# Altium footprint library OT Library.PcbLib: 396 footprints (part 9 of 25)
Each footprint in its own frame and in the unit in brackets; x right, y up, seen from the top. Pads: shape width x height; smd on the part's side, far side on the other; paste and mask are expansions set on the pad; w line width, h text height; cw(c..) or ccw(c..) is an arc to the next point about the centre after c.
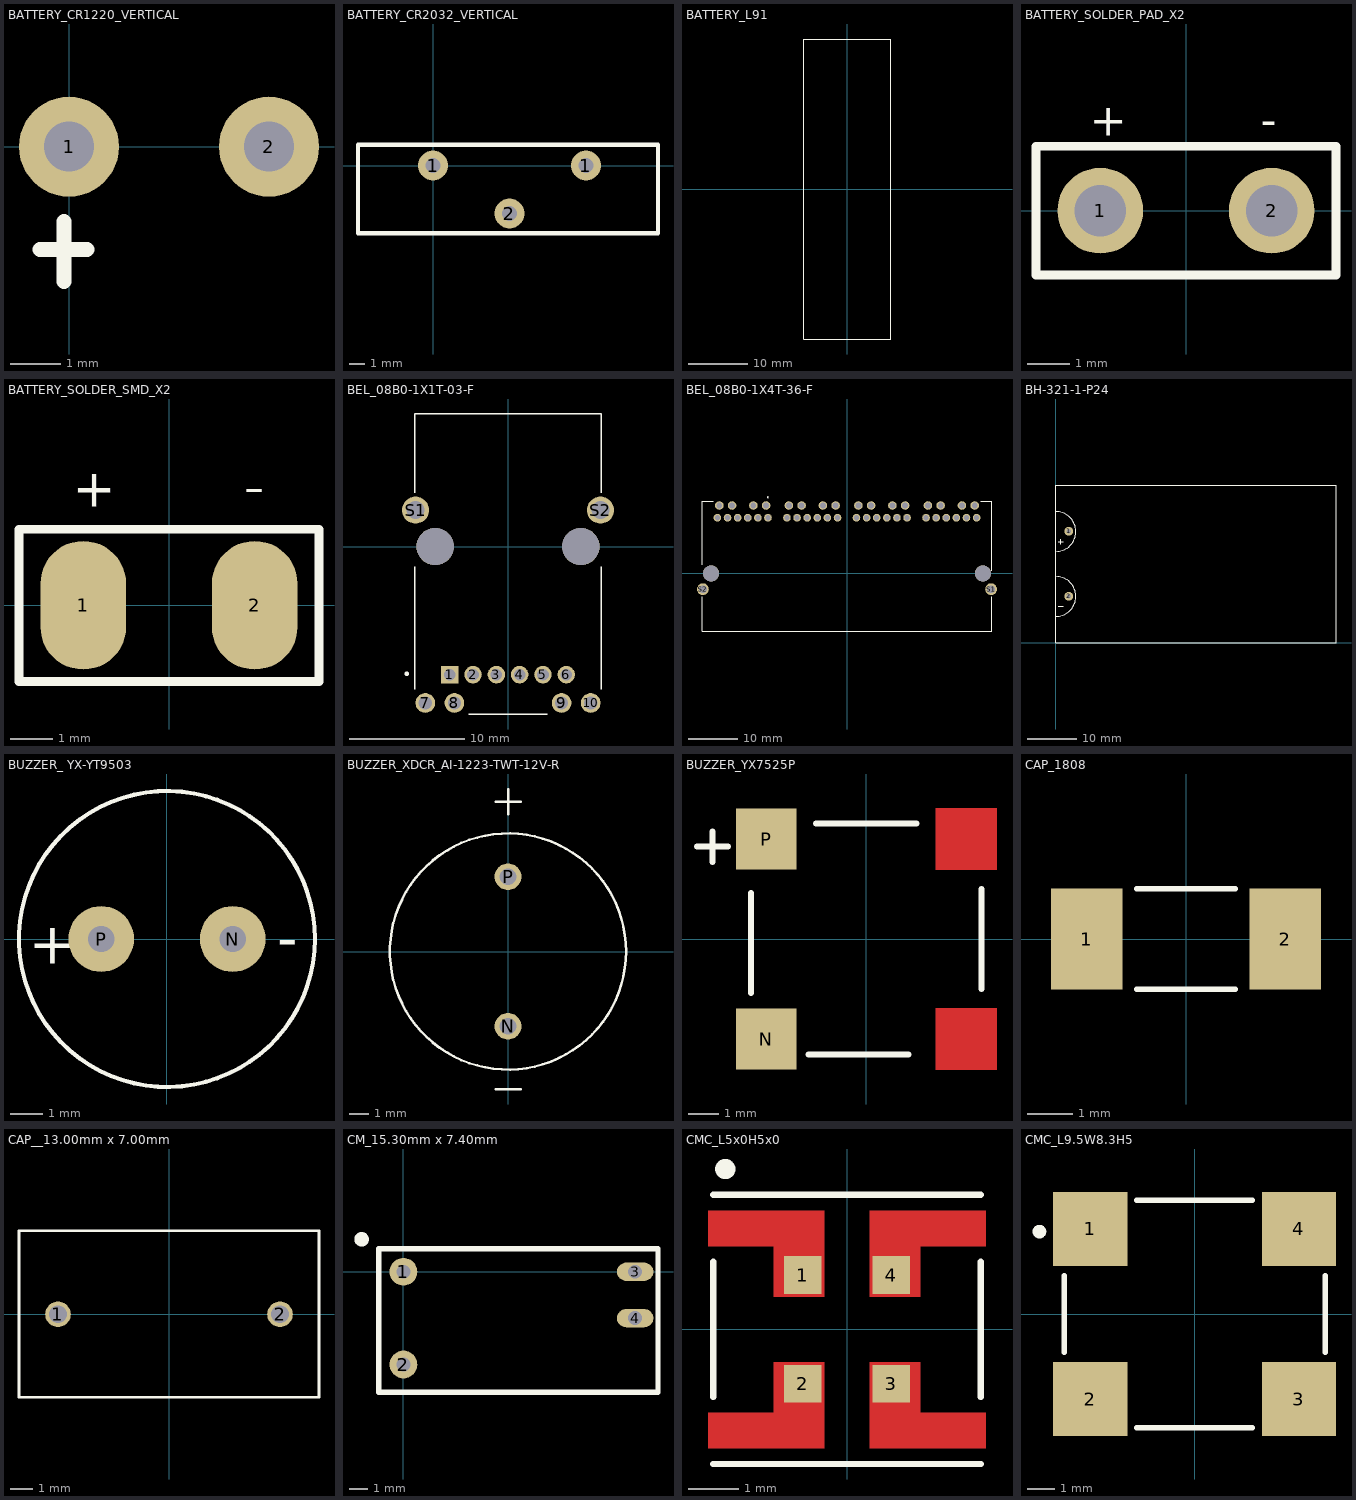
[diagram p8: the footprints below, top view; thin cyan lines are the x and y axes]

## BATTERY_CR1220_VERTICAL [mm]
pads (2):
  round 2 hole 1: 1(0,0) 2(4,0)
Top Overlay:
  lines w0.3: -0.584,-2.057 0.356,-2.057 ; -0.102,-2.692 -0.102,-1.499
3D body: height 15.18, standoff -1.17, extent -4.42,-0.145 8.18,3.505

## BATTERY_CR2032_VERTICAL [mm]
pads (3):
  round 2 hole 1: 1(0,0) 1(10.2,0) 2(5.1,-3.2)
Top Overlay:
  lines w0.3: -5,-4.5 15,-4.5 15,1.372 -5,1.372 -5,-4.5
3D body: height 22.01, standoff -3, extent -5.008,-3.558 15.008,0.25

## BATTERY_L91 [mm]
Top Overlay:
  lines w0.2: -7.366,-25.4 -7.366,25.4 -7.112,25.4 7.366,25.4 7.366,-25.4 -7.366,-25.4
3D body: height 9.25, standoff -5.25, extent -7.252,-25.375 7.252,25.375

## BATTERY_SOLDER_PAD_X2 [mm] "4MM"
pads (2):
  round 2 hole 1.2: 1(-2,0) 2(2,0)
Top Overlay:
  lines w0.2: -3.5,-1.5 3.5,-1.5 3.5,1.5 -3.5,1.5 -3.5,-1.5
  text "-" at 1.75,1.75 h0.76
  text "+" at -2.25,1.75 h0.76

## BATTERY_SOLDER_SMD_X2 [mm] "4MM"
pads (2):
  oval 2x3 smd: 1(-2,0) 2(2,0)
Top Overlay:
  lines w0.2: -3.5,-1.778 -3.5,1.778 3.5,1.778 3.5,-1.778 -3.5,-1.778
  text "+" at -2.25,2.004 h1.5
  text "-" at 1.75,2.004 h1.7
3D body: height 0.3, standoff -0.05, extent -3.057,-1.533 -1.007,1.533
3D body: height 0.3, standoff -0.05, extent 0.975,-1.533 3.025,1.533

## BEL_08B0-1X1T-03-F [mil]
pads (14):
  rect 60x60 hole 40: 1(-200,-440)
  round 60 hole 40: 2(-120,-440) 3(-40,-440) 4(40,-440) 5(120,-440) 6(200,-440)
  round 67.5 hole 45: 7(-284,-537) 8(-184,-537) 9(184,-537) 10(284,-537)
  round 93 hole 62: S1(-317.5,125) S2(317.5,125)
  round 128 hole 128 unplated: ""(-250,0) ""(250,0)
Top Overlay:
  circle w7.87: c-347.71,-436.67 r3.94
  lines w5: -321,-490 -321,-70 ; -321,185 -321,455 321,455 321,185 ; -135,-575 135,-575 ; 321,-490 321,-70
3D body: height 606, standoff -130, extent -375.87,-572.99 375.88,457.01

## BEL_08B0-1X4T-36-F [mil]
pads (44):
  round 60 hole 40: 1_1(-625,440) 1_2(-75,440) 1_3(475,440) 1_4(1025,440) 2_1(-705,440) 2_2(-155,440) 2_3(395,440) 2_4(945,440) 3_1(-785,440) 3_2(-235,440) 3_3(315,440) 3_4(865,440) 4_1(-865,440) 4_2(-315,440) 4_3(235,440) 4_4(785,440) 5_1(-945,440) 5_2(-395,440) 5_3(155,440) 5_4(705,440) 6_1(-1025,440) 6_2(-475,440) 6_3(75,440) 6_4(625,440)
  round 67.5 hole 45: 7_1(-640.5,537) 7_2(-90.5,537) 7_3(459.5,537) 7_4(1009.5,537) 8_1(-740.5,537) 8_2(-190.5,537) 8_3(359.5,537) 8_4(909.5,537) 9_1(-909.5,537) 9_2(-359.5,537) 9_3(190.5,537) 9_4(740.5,537) 10_1(-1009.5,537) 10_2(-459.5,537) 10_3(90.5,537) 10_4(640.5,537)
  round 93 hole 62: S1(1140,-125) S2(-1140,-125)
  round 128 hole 128 unplated: ""(-1075,0) ""(1075,0)
Top Overlay:
  circle w7.87: c-625,601.67 r3.94
  lines w5: -1146,-185 -1146,-457 1146,-457 1146,-185 ; -1146,70 -1146,570 -1056,570 ; 1056,570 1146,570 1146,20
3D body: height 568.45, standoff -140, extent -1200.46,-455 1200.45,570

## BH-321-1-P24 [mm]
pads (2):
  round 1.8 hole 0.9: 1(2.6,22.675) 2(2.6,9.425)
Top Overlay:
  lines w0.2: 0,5.334 ccw(c0,9.398) 0,13.462 ; 0,18.542 ccw(c0,22.606) 0,26.67 ; 0,32 0,0 57,0 ; 0,32.004 57,32.004 57,0.004 ; 0.508,7.366 1.524,7.366 ; 0.508,20.574 1.524,20.574 ; 1.016,20.066 1.016,21.082
3D body: height 15.7, standoff -13.1, extent -0.102,-0.048 56.998,32.052

## BUZZER_ YX-YT9503 [mm] "9.00x5.50"
height 5
pads (2):
  round 2 hole 0.8: N(2,0) P(-2,0)
Top Overlay:
  circle w0.127: c0,0 r4.5
  text "-" at 3.353,-0.584 h1.27
  text "+" at -4.197,-0.752 h1.27
3D body: height 4.8, standoff -4.5, extent -4.474,-4.5 4.526,4.5

## BUZZER_XDCR_AI-1223-TWT-12V-R [mm] "12.00x9.50"
height 9.7
pads (2):
  round 1.358 hole 0.85: N(0,-3.8) P(0,3.8)
Top Overlay:
  circle w0.127: c0,0 r6
  lines w0.127: -0.635,-6.985 0.635,-6.985 ; -0.635,7.62 0.635,7.62 ; 0,6.985 0,8.255
3D body: height 9.75, standoff -5.8, extent -6,-6 5.999,7.44

## BUZZER_YX7525P [mm] "7.50x7.50"
height 2.5
pads (2):
  rect 2x2 smd: N(-3.302,-3.302) P(-3.302,3.302)
Top Layer:
  rectangle: 2.286,2.286 4.318,4.318
  rectangle: 2.286,-4.318 4.318,-2.286
Top Overlay:
  lines w0.2: -5.588,3.048 -4.572,3.048 ; -5.08,2.54 -5.08,3.556 ; -3.81,-1.778 -3.81,1.524 ; -1.905,-3.81 1.397,-3.81 ; -1.651,3.81 1.651,3.81 ; 3.81,-1.651 3.81,1.651
Top Solder:
  rectangle: 2.286,-4.318 4.318,-2.286
  rectangle: 2.286,2.286 4.318,4.318
3D body: height 2.5, standoff -0.01, extent -3.75,-3.75 3.75,3.75

## CAP_1808 [mm] "0.185\" L x 0.079\" W (4.70mm x 2.00mm)"
height 1.75
pads (2):
  rect 1.56x2.22 smd: 1(-2.175,0) 2(2.175,0)
Top Overlay:
  lines w0.127: -1.08,-1.1 1.08,-1.1 ; -1.08,1.1 1.08,1.1
3D body: height 1.75, standoff 0, extent -2.35,-1 2.35,1

## CAP__13.00mm x 7.00mm [mm]
pads (2):
  round 1.15 hole 0.8: 1(-5,0) 2(5,0)
Top Overlay:
  lines w0.127: -6.756,-3.734 6.756,-3.734 6.756,3.759 -6.756,3.759 -6.756,-3.734
3D body: height 13.51, standoff -5.08, extent -6.756,-3.746 6.756,3.746

## CM_15.30mm x 7.40mm [mil]
pads (4):
  round 60 hole 30: 1(0,0) 2(0,-200)
  oval 78.74x39.37 hole 30: 3(500,0) 4(500,-100)
Top Overlay:
  circle w15.75: c-90,70 r7.87
  lines w11.81: -53.15,-260 549.21,-260 549.21,50 -53.15,50 -53.15,-260
3D body: height 688.98, standoff -110.24, extent -49.21,-260 549.21,27.4

## CMC_L5x0H5x0 [mm]
height 4.5
pads (4):
  rect 0.75x0.75 smd: 1(-0.875,1.075) 2(-0.875,-1.075) 3(0.875,-1.075) 4(0.875,1.075)
Top Layer:
  region: -0.45,0.65 -1.45,0.65 -1.45,1.65 -2.75,1.65 -2.75,2.35 -0.45,2.35
  region: 1.45,-1.65 2.75,-1.65 2.75,-2.35 0.45,-2.35 0.45,-0.65 1.45,-0.65
  region: 2.75,1.65 1.45,1.65 1.45,0.65 0.45,0.65 0.45,2.35 2.75,2.35
  region: -0.45,-2.35 -2.75,-2.35 -2.75,-1.65 -1.45,-1.65 -1.45,-0.65 -0.45,-0.65
Top Overlay:
  circle w0.2: c-2.41,3.176 r0.1
  lines w0.127: -2.65,-2.663 2.65,-2.663 ; -2.65,-1.336 -2.65,1.336 ; -2.65,2.663 2.65,2.663 ; 2.65,-1.336 2.65,1.336
Top Paste:
  region: -0.45,0.65 -1.45,0.65 -1.45,1.65 -2.75,1.65 -2.75,2.35 -0.45,2.35
  region: 1.45,-1.65 2.75,-1.65 2.75,-2.35 0.45,-2.35 0.45,-0.65 1.45,-0.65
  region: 2.75,1.65 1.45,1.65 1.45,0.65 0.45,0.65 0.45,2.35 2.75,2.35
  region: -0.45,-2.35 -2.75,-2.35 -2.75,-1.65 -1.45,-1.65 -1.45,-0.65 -0.45,-0.65
Top Solder:
  region: -0.35,0.55 -1.55,0.55 -1.55,1.55 -2.85,1.55 -2.85,2.45 -0.35,2.45
  region: 1.55,-1.55 2.85,-1.55 2.85,-2.45 0.35,-2.45 0.35,-0.55 1.55,-0.55
  region: 2.85,1.55 1.55,1.55 1.55,0.55 0.35,0.55 0.35,2.45 2.85,2.45
  region: -0.35,-2.45 -2.85,-2.45 -2.85,-1.55 -1.55,-1.55 -1.55,-0.55 -0.35,-0.55
3D body: height 4.5, standoff 0, extent -2.5,-2.5 2.5,2.5

## CMC_L9.5W8.3H5 [mm] "SMD Inductor, Body 8,3x9,5mm"
height 5.3
pads (4):
  rect 2.7x2.7 smd: 1(-3.8,3.1) 2(-3.8,-3.1) 3(3.8,-3.1) 4(3.8,3.1)
Top Overlay:
  circle w0.25: c-5.65,3 r0.125
  lines w0.2: -4.75,-1.4 -4.75,1.4 ; -2.1,-4.15 2.1,-4.15 ; -2.1,4.15 2.1,4.15 ; 4.75,-1.4 4.75,1.4
3D body: height 5.1, standoff 0, extent -4.75,-4.15 4.75,4.15